# Altium integrated library Samtec_PC104_Plus.IntLib: 120 symbols (part 1 of 2) (continued)
## ESQT-108-02-M-D-315-PIH
designator J?
PC/104-Plus(TM) Flexible Elevated Socket Strips, Through-hole, Vertical, -55 to 125 degC, 2 mm Pitch, 16-Pin, Female, RoHS; Manufacturer: Samtec; PartNumber: ESQT-108-02-M-D-315-PIH; Pitch: 2 mm; DatasheetVersion: F-214; PackageVersion: BK, 10/1995; PackageReference: ESQT-108-02-X-D-315-PIH; PackageDescription: Elevated SQT ASSM; Orientation: Vertical; RoHS: True; Temperature Range: -55 to 125 degC; Mounting Technology: Through-hole; ComponentLink1Description: Manufacturer URL; ComponentLink1URL: http://www.samtec.com; ComponentLink2Description: Datasheet; ComponentLink2URL: http://www.samtec.com/documents/webfiles/pdf/ESQT_TH.PDF; ComponentLink3Description: Package Specification; ComponentLink3URL: http://www.samtec.com/documents/webfiles/cpdf/ESQT-1XX-XX-XX-X-XXX-XXX-XX-MKT.pdf
footprint SMTC-ESQT-108-02-X-D-315-PIH (Flexible Elevated Socket, 2x8 Pins, Vertical, 2mm Pitch, Female)
pins: 1, 2, 3, 4, 5, 6, 7, 8, 9, 10, 11, 12, 13, 14, 15, 16

## ESQT-110-02-F-D-342
designator J?
PC/104-Plus(TM) Flexible Elevated Socket Strips, Through-hole, Vertical, -55 to 125 degC, 2 mm Pitch, 20-Pin, Female, RoHS; Manufacturer: Samtec; PartNumber: ESQT-110-02-F-D-342; Pitch: 2 mm; DatasheetVersion: F-214; PackageVersion: BK, 10/1995; PackageReference: ESQT-110-02-X-D-342; PackageDescription: Elevated SQT ASSM; Orientation: Vertical; RoHS: True; Temperature Range: -55 to 125 degC; Mounting Technology: Through-hole; ComponentLink1Description: Manufacturer URL; ComponentLink1URL: http://www.samtec.com; ComponentLink2Description: Datasheet; ComponentLink2URL: http://www.samtec.com/documents/webfiles/pdf/ESQT_TH.PDF; ComponentLink3Description: Package Specification; ComponentLink3URL: http://www.samtec.com/documents/webfiles/cpdf/ESQT-1XX-XX-XX-X-XXX-XXX-XX-MKT.pdf
footprint SMTC-ESQT-110-02-X-D-342 (Flexible Elevated Socket, 2x10 Pins, Vertical, 2mm Pitch, Female)
pins: 1, 2, 3, 4, 5, 6, 7, 8, 9, 10, 11, 12, 13, 14, 15, 16, 17, 18, 19, 20

## ESQT-110-02-F-D-470
designator J?
PC/104-Plus(TM) Flexible Elevated Socket Strips, Through-hole, Vertical, -55 to 125 degC, 2 mm Pitch, 20-Pin, Female, RoHS; Manufacturer: Samtec; PartNumber: ESQT-110-02-F-D-470; Pitch: 2 mm; DatasheetVersion: F-214; PackageVersion: BK, 10/1995; PackageReference: ESQT-110-02-X-D-470; PackageDescription: Elevated SQT ASSM; Orientation: Vertical; RoHS: True; Temperature Range: -55 to 125 degC; Mounting Technology: Through-hole; ComponentLink1Description: Manufacturer URL; ComponentLink1URL: http://www.samtec.com; ComponentLink2Description: Datasheet; ComponentLink2URL: http://www.samtec.com/documents/webfiles/pdf/ESQT_TH.PDF; ComponentLink3Description: Package Specification; ComponentLink3URL: http://www.samtec.com/documents/webfiles/cpdf/ESQT-1XX-XX-XX-X-XXX-XXX-XX-MKT.pdf
footprint SMTC-ESQT-110-02-X-D-470 (Flexible Elevated Socket, 2x10 Pins, Vertical, 2mm Pitch, Female)
pins: 1, 2, 3, 4, 5, 6, 7, 8, 9, 10, 11, 12, 13, 14, 15, 16, 17, 18, 19, 20

## ESQT-110-02-GF-D-342
designator J?
PC/104-Plus(TM) Flexible Elevated Socket Strips, Through-hole, Vertical, -55 to 125 degC, 2 mm Pitch, 20-Pin, Female, RoHS; Manufacturer: Samtec; PartNumber: ESQT-110-02-GF-D-342; Pitch: 2 mm; DatasheetVersion: F-214; PackageVersion: BK, 10/1995; PackageReference: ESQT-110-02-X-D-342; PackageDescription: Elevated SQT ASSM; Orientation: Vertical; RoHS: True; Temperature Range: -55 to 125 degC; Mounting Technology: Through-hole; ComponentLink1Description: Manufacturer URL; ComponentLink1URL: http://www.samtec.com; ComponentLink2Description: Datasheet; ComponentLink2URL: http://www.samtec.com/documents/webfiles/pdf/ESQT_TH.PDF; ComponentLink3Description: Package Specification; ComponentLink3URL: http://www.samtec.com/documents/webfiles/cpdf/ESQT-1XX-XX-XX-X-XXX-XXX-XX-MKT.pdf
footprint SMTC-ESQT-110-02-X-D-342 (Flexible Elevated Socket, 2x10 Pins, Vertical, 2mm Pitch, Female)
pins: 1, 2, 3, 4, 5, 6, 7, 8, 9, 10, 11, 12, 13, 14, 15, 16, 17, 18, 19, 20

## ESQT-110-02-GF-D-470
designator J?
PC/104-Plus(TM) Flexible Elevated Socket Strips, Through-hole, Vertical, -55 to 125 degC, 2 mm Pitch, 20-Pin, Female, RoHS; Manufacturer: Samtec; PartNumber: ESQT-110-02-GF-D-470; Pitch: 2 mm; DatasheetVersion: F-214; PackageVersion: BK, 10/1995; PackageReference: ESQT-110-02-X-D-470; PackageDescription: Elevated SQT ASSM; Orientation: Vertical; RoHS: True; Temperature Range: -55 to 125 degC; Mounting Technology: Through-hole; ComponentLink1Description: Manufacturer URL; ComponentLink1URL: http://www.samtec.com; ComponentLink2Description: Datasheet; ComponentLink2URL: http://www.samtec.com/documents/webfiles/pdf/ESQT_TH.PDF; ComponentLink3Description: Package Specification; ComponentLink3URL: http://www.samtec.com/documents/webfiles/cpdf/ESQT-1XX-XX-XX-X-XXX-XXX-XX-MKT.pdf
footprint SMTC-ESQT-110-02-X-D-470 (Flexible Elevated Socket, 2x10 Pins, Vertical, 2mm Pitch, Female)
pins: 1, 2, 3, 4, 5, 6, 7, 8, 9, 10, 11, 12, 13, 14, 15, 16, 17, 18, 19, 20

## ESQT-110-02-L-D-342
designator J?
PC/104-Plus(TM) Flexible Elevated Socket Strips, Through-hole, Vertical, -55 to 125 degC, 2 mm Pitch, 20-Pin, Female, RoHS; Manufacturer: Samtec; PartNumber: ESQT-110-02-L-D-342; Pitch: 2 mm; DatasheetVersion: F-214; PackageVersion: BK, 10/1995; PackageReference: ESQT-110-02-X-D-342; PackageDescription: Elevated SQT ASSM; Orientation: Vertical; RoHS: True; Temperature Range: -55 to 125 degC; Mounting Technology: Through-hole; ComponentLink1Description: Manufacturer URL; ComponentLink1URL: http://www.samtec.com; ComponentLink2Description: Datasheet; ComponentLink2URL: http://www.samtec.com/documents/webfiles/pdf/ESQT_TH.PDF; ComponentLink3Description: Package Specification; ComponentLink3URL: http://www.samtec.com/documents/webfiles/cpdf/ESQT-1XX-XX-XX-X-XXX-XXX-XX-MKT.pdf
footprint SMTC-ESQT-110-02-X-D-342 (Flexible Elevated Socket, 2x10 Pins, Vertical, 2mm Pitch, Female)
pins: 1, 2, 3, 4, 5, 6, 7, 8, 9, 10, 11, 12, 13, 14, 15, 16, 17, 18, 19, 20

## ESQT-110-02-L-D-470
designator J?
PC/104-Plus(TM) Flexible Elevated Socket Strips, Through-hole, Vertical, -55 to 125 degC, 2 mm Pitch, 20-Pin, Female, RoHS; Manufacturer: Samtec; PartNumber: ESQT-110-02-L-D-470; Pitch: 2 mm; DatasheetVersion: F-214; PackageVersion: BK, 10/1995; PackageReference: ESQT-110-02-X-D-470; PackageDescription: Elevated SQT ASSM; Orientation: Vertical; RoHS: True; Temperature Range: -55 to 125 degC; Mounting Technology: Through-hole; ComponentLink1Description: Manufacturer URL; ComponentLink1URL: http://www.samtec.com; ComponentLink2Description: Datasheet; ComponentLink2URL: http://www.samtec.com/documents/webfiles/pdf/ESQT_TH.PDF; ComponentLink3Description: Package Specification; ComponentLink3URL: http://www.samtec.com/documents/webfiles/cpdf/ESQT-1XX-XX-XX-X-XXX-XXX-XX-MKT.pdf
footprint SMTC-ESQT-110-02-X-D-470 (Flexible Elevated Socket, 2x10 Pins, Vertical, 2mm Pitch, Female)
pins: 1, 2, 3, 4, 5, 6, 7, 8, 9, 10, 11, 12, 13, 14, 15, 16, 17, 18, 19, 20

## ESQT-110-02-M-D-342
designator J?
PC/104-Plus(TM) Flexible Elevated Socket Strips, Through-hole, Vertical, -55 to 125 degC, 2 mm Pitch, 20-Pin, Female, RoHS; Manufacturer: Samtec; PartNumber: ESQT-110-02-M-D-342; Pitch: 2 mm; DatasheetVersion: F-214; PackageVersion: BK, 10/1995; PackageReference: ESQT-110-02-X-D-342; PackageDescription: Elevated SQT ASSM; Orientation: Vertical; RoHS: True; Temperature Range: -55 to 125 degC; Mounting Technology: Through-hole; ComponentLink1Description: Manufacturer URL; ComponentLink1URL: http://www.samtec.com; ComponentLink2Description: Datasheet; ComponentLink2URL: http://www.samtec.com/documents/webfiles/pdf/ESQT_TH.PDF; ComponentLink3Description: Package Specification; ComponentLink3URL: http://www.samtec.com/documents/webfiles/cpdf/ESQT-1XX-XX-XX-X-XXX-XXX-XX-MKT.pdf
footprint SMTC-ESQT-110-02-X-D-342 (Flexible Elevated Socket, 2x10 Pins, Vertical, 2mm Pitch, Female)
pins: 1, 2, 3, 4, 5, 6, 7, 8, 9, 10, 11, 12, 13, 14, 15, 16, 17, 18, 19, 20

## ESQT-110-02-M-D-470
designator J?
PC/104-Plus(TM) Flexible Elevated Socket Strips, Through-hole, Vertical, -55 to 125 degC, 2 mm Pitch, 20-Pin, Female, RoHS; Manufacturer: Samtec; PartNumber: ESQT-110-02-M-D-470; Pitch: 2 mm; DatasheetVersion: F-214; PackageVersion: BK, 10/1995; PackageReference: ESQT-110-02-X-D-470; PackageDescription: Elevated SQT ASSM; Orientation: Vertical; RoHS: True; Temperature Range: -55 to 125 degC; Mounting Technology: Through-hole; ComponentLink1Description: Manufacturer URL; ComponentLink1URL: http://www.samtec.com; ComponentLink2Description: Datasheet; ComponentLink2URL: http://www.samtec.com/documents/webfiles/pdf/ESQT_TH.PDF; ComponentLink3Description: Package Specification; ComponentLink3URL: http://www.samtec.com/documents/webfiles/cpdf/ESQT-1XX-XX-XX-X-XXX-XXX-XX-MKT.pdf
footprint SMTC-ESQT-110-02-X-D-470 (Flexible Elevated Socket, 2x10 Pins, Vertical, 2mm Pitch, Female)
pins: 1, 2, 3, 4, 5, 6, 7, 8, 9, 10, 11, 12, 13, 14, 15, 16, 17, 18, 19, 20

## ESQT-113-02-F-D-665
designator J?
PC/104-Plus(TM) Flexible Elevated Socket Strips, Through-hole, Vertical, -55 to 125 degC, 2 mm Pitch, 26-Pin, Female, RoHS; Manufacturer: Samtec; PartNumber: ESQT-113-02-F-D-665; Pitch: 2 mm; DatasheetVersion: F-214; PackageVersion: BK, 10/1995; PackageReference: ESQT-113-02-X-D-665; PackageDescription: Elevated SQT ASSM; Orientation: Vertical; RoHS: True; Temperature Range: -55 to 125 degC; Mounting Technology: Through-hole; ComponentLink1Description: Manufacturer URL; ComponentLink1URL: http://www.samtec.com; ComponentLink2Description: Datasheet; ComponentLink2URL: http://www.samtec.com/documents/webfiles/pdf/ESQT_TH.PDF; ComponentLink3Description: Package Specification; ComponentLink3URL: http://www.samtec.com/documents/webfiles/cpdf/ESQT-1XX-XX-XX-X-XXX-XXX-XX-MKT.pdf
footprint SMTC-ESQT-113-02-X-D-665 (Flexible Elevated Socket, 2x13 Pins, Vertical, 2mm Pitch, Female)
pins: 1, 2, 3, 4, 5, 6, 7, 8, 9, 10, 11, 12, 13, 14, 15, 16, 17, 18, 19, 20, 21, 22, 23, 24, 25, 26

## ESQT-113-02-F-D-730
designator J?
PC/104-Plus(TM) Flexible Elevated Socket Strips, Through-hole, Vertical, -55 to 125 degC, 2 mm Pitch, 26-Pin, Female, RoHS; Manufacturer: Samtec; PartNumber: ESQT-113-02-F-D-730; Pitch: 2 mm; DatasheetVersion: F-214; PackageVersion: BK, 10/1995; PackageReference: ESQT-113-02-X-D-730; PackageDescription: Elevated SQT ASSM; Orientation: Vertical; RoHS: True; Temperature Range: -55 to 125 degC; Mounting Technology: Through-hole; ComponentLink1Description: Manufacturer URL; ComponentLink1URL: http://www.samtec.com; ComponentLink2Description: Datasheet; ComponentLink2URL: http://www.samtec.com/documents/webfiles/pdf/ESQT_TH.PDF; ComponentLink3Description: Package Specification; ComponentLink3URL: http://www.samtec.com/documents/webfiles/cpdf/ESQT-1XX-XX-XX-X-XXX-XXX-XX-MKT.pdf
footprint SMTC-ESQT-113-02-X-D-730 (Flexible Elevated Socket, 2x13 Pins, Vertical, 2mm Pitch, Female)
pins: 1, 2, 3, 4, 5, 6, 7, 8, 9, 10, 11, 12, 13, 14, 15, 16, 17, 18, 19, 20, 21, 22, 23, 24, 25, 26

## ESQT-113-02-GF-D-665
designator J?
PC/104-Plus(TM) Flexible Elevated Socket Strips, Through-hole, Vertical, -55 to 125 degC, 2 mm Pitch, 26-Pin, Female, RoHS; Manufacturer: Samtec; PartNumber: ESQT-113-02-GF-D-665; Pitch: 2 mm; DatasheetVersion: F-214; PackageVersion: BK, 10/1995; PackageReference: ESQT-113-02-X-D-665; PackageDescription: Elevated SQT ASSM; Orientation: Vertical; RoHS: True; Temperature Range: -55 to 125 degC; Mounting Technology: Through-hole; ComponentLink1Description: Manufacturer URL; ComponentLink1URL: http://www.samtec.com; ComponentLink2Description: Datasheet; ComponentLink2URL: http://www.samtec.com/documents/webfiles/pdf/ESQT_TH.PDF; ComponentLink3Description: Package Specification; ComponentLink3URL: http://www.samtec.com/documents/webfiles/cpdf/ESQT-1XX-XX-XX-X-XXX-XXX-XX-MKT.pdf
footprint SMTC-ESQT-113-02-X-D-665 (Flexible Elevated Socket, 2x13 Pins, Vertical, 2mm Pitch, Female)
pins: 1, 2, 3, 4, 5, 6, 7, 8, 9, 10, 11, 12, 13, 14, 15, 16, 17, 18, 19, 20, 21, 22, 23, 24, 25, 26

## ESQT-113-02-GF-D-730
designator J?
PC/104-Plus(TM) Flexible Elevated Socket Strips, Through-hole, Vertical, -55 to 125 degC, 2 mm Pitch, 26-Pin, Female, RoHS; Manufacturer: Samtec; PartNumber: ESQT-113-02-GF-D-730; Pitch: 2 mm; DatasheetVersion: F-214; PackageVersion: BK, 10/1995; PackageReference: ESQT-113-02-X-D-730; PackageDescription: Elevated SQT ASSM; Orientation: Vertical; RoHS: True; Temperature Range: -55 to 125 degC; Mounting Technology: Through-hole; ComponentLink1Description: Manufacturer URL; ComponentLink1URL: http://www.samtec.com; ComponentLink2Description: Datasheet; ComponentLink2URL: http://www.samtec.com/documents/webfiles/pdf/ESQT_TH.PDF; ComponentLink3Description: Package Specification; ComponentLink3URL: http://www.samtec.com/documents/webfiles/cpdf/ESQT-1XX-XX-XX-X-XXX-XXX-XX-MKT.pdf
footprint SMTC-ESQT-113-02-X-D-730 (Flexible Elevated Socket, 2x13 Pins, Vertical, 2mm Pitch, Female)
pins: 1, 2, 3, 4, 5, 6, 7, 8, 9, 10, 11, 12, 13, 14, 15, 16, 17, 18, 19, 20, 21, 22, 23, 24, 25, 26

## ESQT-113-02-L-D-665
designator J?
PC/104-Plus(TM) Flexible Elevated Socket Strips, Through-hole, Vertical, -55 to 125 degC, 2 mm Pitch, 26-Pin, Female, RoHS; Manufacturer: Samtec; PartNumber: ESQT-113-02-L-D-665; Pitch: 2 mm; DatasheetVersion: F-214; PackageVersion: BK, 10/1995; PackageReference: ESQT-113-02-X-D-665; PackageDescription: Elevated SQT ASSM; Orientation: Vertical; RoHS: True; Temperature Range: -55 to 125 degC; Mounting Technology: Through-hole; ComponentLink1Description: Manufacturer URL; ComponentLink1URL: http://www.samtec.com; ComponentLink2Description: Datasheet; ComponentLink2URL: http://www.samtec.com/documents/webfiles/pdf/ESQT_TH.PDF; ComponentLink3Description: Package Specification; ComponentLink3URL: http://www.samtec.com/documents/webfiles/cpdf/ESQT-1XX-XX-XX-X-XXX-XXX-XX-MKT.pdf
footprint SMTC-ESQT-113-02-X-D-665 (Flexible Elevated Socket, 2x13 Pins, Vertical, 2mm Pitch, Female)
pins: 1, 2, 3, 4, 5, 6, 7, 8, 9, 10, 11, 12, 13, 14, 15, 16, 17, 18, 19, 20, 21, 22, 23, 24, 25, 26

## ESQT-113-02-L-D-730
designator J?
PC/104-Plus(TM) Flexible Elevated Socket Strips, Through-hole, Vertical, -55 to 125 degC, 2 mm Pitch, 26-Pin, Female, RoHS; Manufacturer: Samtec; PartNumber: ESQT-113-02-L-D-730; Pitch: 2 mm; DatasheetVersion: F-214; PackageVersion: BK, 10/1995; PackageReference: ESQT-113-02-X-D-730; PackageDescription: Elevated SQT ASSM; Orientation: Vertical; RoHS: True; Temperature Range: -55 to 125 degC; Mounting Technology: Through-hole; ComponentLink1Description: Manufacturer URL; ComponentLink1URL: http://www.samtec.com; ComponentLink2Description: Datasheet; ComponentLink2URL: http://www.samtec.com/documents/webfiles/pdf/ESQT_TH.PDF; ComponentLink3Description: Package Specification; ComponentLink3URL: http://www.samtec.com/documents/webfiles/cpdf/ESQT-1XX-XX-XX-X-XXX-XXX-XX-MKT.pdf
footprint SMTC-ESQT-113-02-X-D-730 (Flexible Elevated Socket, 2x13 Pins, Vertical, 2mm Pitch, Female)
pins: 1, 2, 3, 4, 5, 6, 7, 8, 9, 10, 11, 12, 13, 14, 15, 16, 17, 18, 19, 20, 21, 22, 23, 24, 25, 26

## ESQT-113-02-M-D-665
designator J?
PC/104-Plus(TM) Flexible Elevated Socket Strips, Through-hole, Vertical, -55 to 125 degC, 2 mm Pitch, 26-Pin, Female, RoHS; Manufacturer: Samtec; PartNumber: ESQT-113-02-M-D-665; Pitch: 2 mm; DatasheetVersion: F-214; PackageVersion: BK, 10/1995; PackageReference: ESQT-113-02-X-D-665; PackageDescription: Elevated SQT ASSM; Orientation: Vertical; RoHS: True; Temperature Range: -55 to 125 degC; Mounting Technology: Through-hole; ComponentLink1Description: Manufacturer URL; ComponentLink1URL: http://www.samtec.com; ComponentLink2Description: Datasheet; ComponentLink2URL: http://www.samtec.com/documents/webfiles/pdf/ESQT_TH.PDF; ComponentLink3Description: Package Specification; ComponentLink3URL: http://www.samtec.com/documents/webfiles/cpdf/ESQT-1XX-XX-XX-X-XXX-XXX-XX-MKT.pdf
footprint SMTC-ESQT-113-02-X-D-665 (Flexible Elevated Socket, 2x13 Pins, Vertical, 2mm Pitch, Female)
pins: 1, 2, 3, 4, 5, 6, 7, 8, 9, 10, 11, 12, 13, 14, 15, 16, 17, 18, 19, 20, 21, 22, 23, 24, 25, 26

## ESQT-113-02-M-D-730
designator J?
PC/104-Plus(TM) Flexible Elevated Socket Strips, Through-hole, Vertical, -55 to 125 degC, 2 mm Pitch, 26-Pin, Female, RoHS; Manufacturer: Samtec; PartNumber: ESQT-113-02-M-D-730; Pitch: 2 mm; DatasheetVersion: F-214; PackageVersion: BK, 10/1995; PackageReference: ESQT-113-02-X-D-730; PackageDescription: Elevated SQT ASSM; Orientation: Vertical; RoHS: True; Temperature Range: -55 to 125 degC; Mounting Technology: Through-hole; ComponentLink1Description: Manufacturer URL; ComponentLink1URL: http://www.samtec.com; ComponentLink2Description: Datasheet; ComponentLink2URL: http://www.samtec.com/documents/webfiles/pdf/ESQT_TH.PDF; ComponentLink3Description: Package Specification; ComponentLink3URL: http://www.samtec.com/documents/webfiles/cpdf/ESQT-1XX-XX-XX-X-XXX-XXX-XX-MKT.pdf
footprint SMTC-ESQT-113-02-X-D-730 (Flexible Elevated Socket, 2x13 Pins, Vertical, 2mm Pitch, Female)
pins: 1, 2, 3, 4, 5, 6, 7, 8, 9, 10, 11, 12, 13, 14, 15, 16, 17, 18, 19, 20, 21, 22, 23, 24, 25, 26

## ESQT-117-03-F-D-350
designator J?
PC/104-Plus(TM) Flexible Elevated Socket Strips, Through-hole, Vertical, -55 to 125 degC, 2 mm Pitch, 34-Pin, Female, RoHS; Manufacturer: Samtec; PartNumber: ESQT-117-03-F-D-350; Pitch: 2 mm; DatasheetVersion: F-214; PackageVersion: BK, 10/1995; PackageReference: ESQT-117-03-X-D-350; PackageDescription: Elevated SQT ASSM; Orientation: Vertical; RoHS: True; Temperature Range: -55 to 125 degC; Mounting Technology: Through-hole; ComponentLink1Description: Manufacturer URL; ComponentLink1URL: http://www.samtec.com; ComponentLink2Description: Datasheet; ComponentLink2URL: http://www.samtec.com/documents/webfiles/pdf/ESQT_TH.PDF; ComponentLink3Description: Package Specification; ComponentLink3URL: http://www.samtec.com/documents/webfiles/cpdf/ESQT-1XX-XX-XX-X-XXX-XXX-XX-MKT.pdf
footprint SMTC-ESQT-117-03-X-D-350 (Flexible Elevated Socket, 2x17 Pins, Vertical, 2mm Pitch, Female)
pins: 1, 2, 3, 4, 5, 6, 7, 8, 9, 10, 11, 12, 13, 14, 15, 16, 17, 18, 19, 20, 21, 22, 23, 24, 25, 26, 27, 28, 29, 30, 31, 32, 33, 34

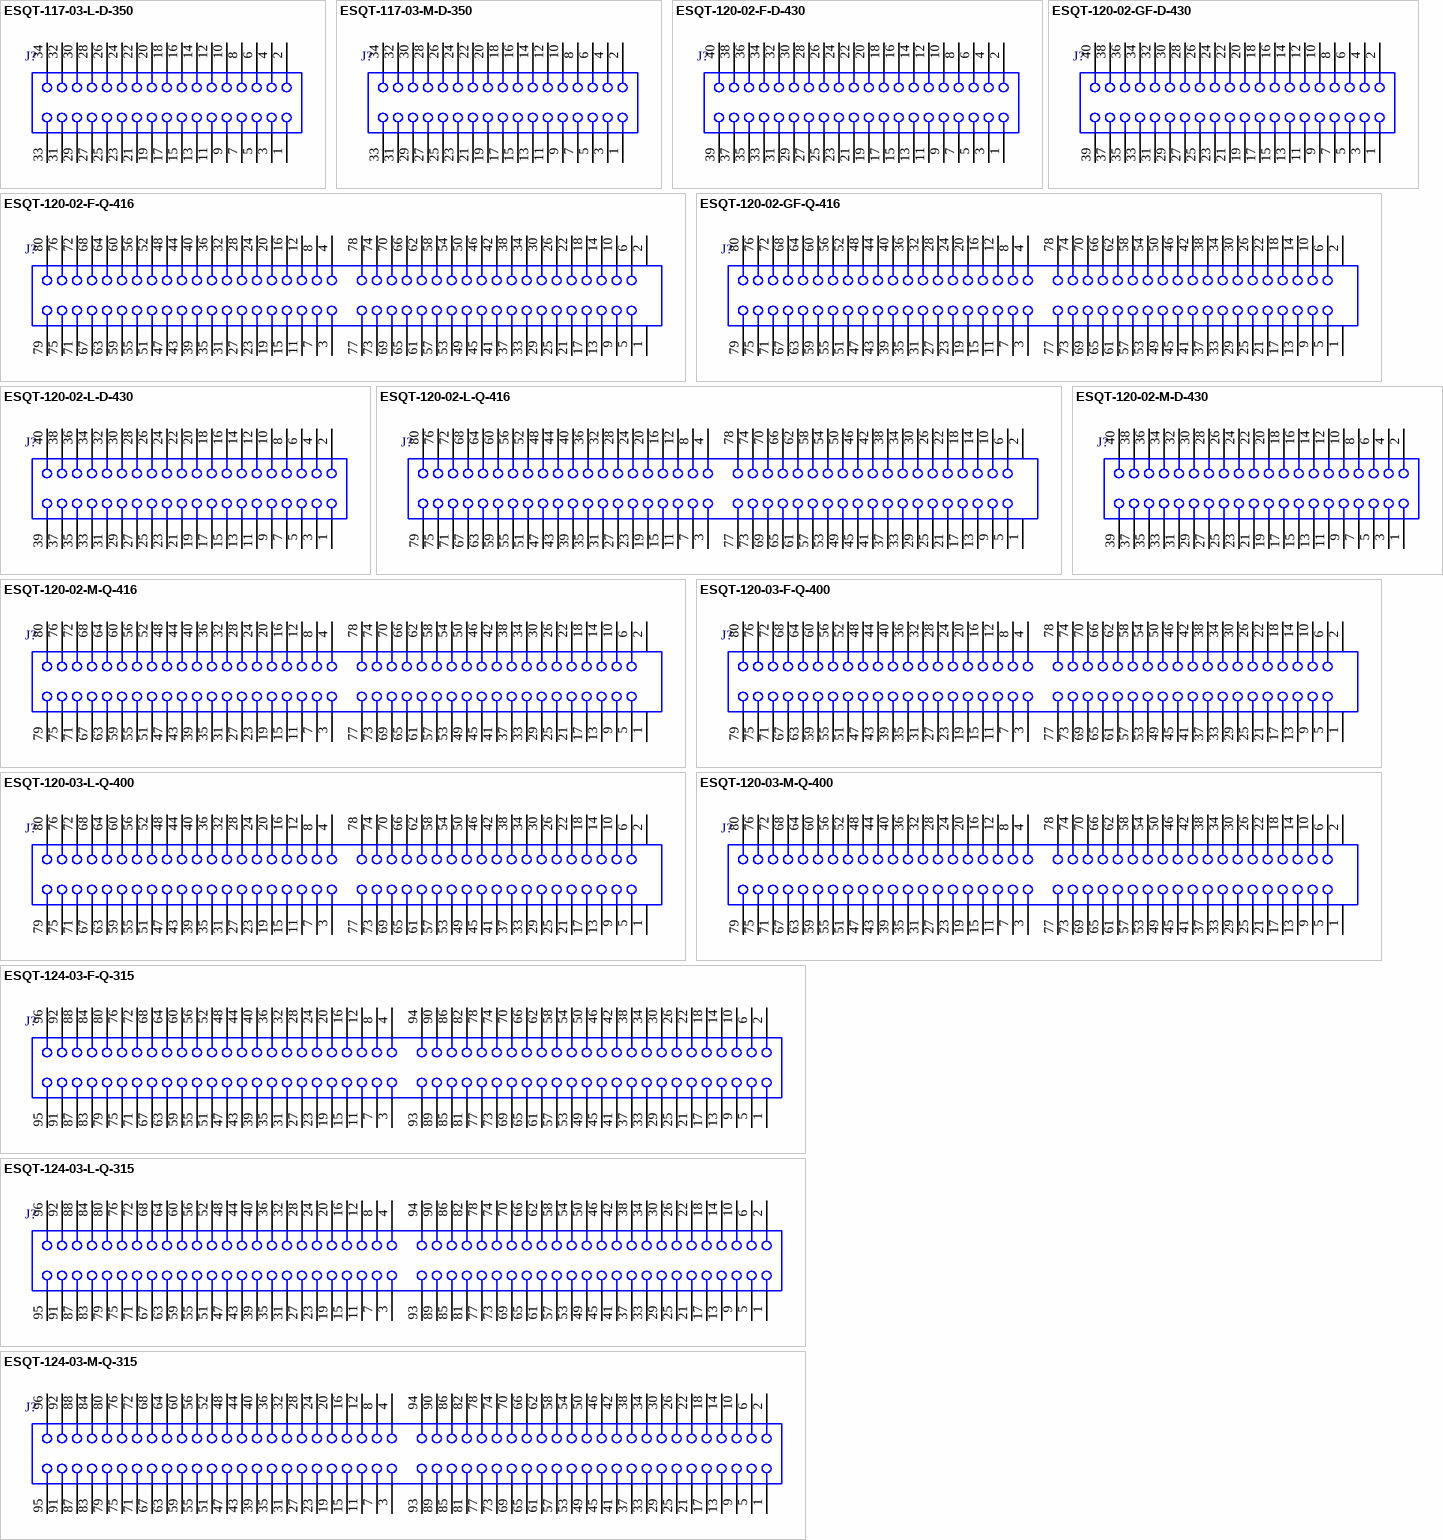
[diagram p3: symbols ESQT-117-03-L-D-350 to ESQT-124-03-M-Q-315]

## ESQT-117-03-L-D-350
designator J?
PC/104-Plus(TM) Flexible Elevated Socket Strips, Through-hole, Vertical, -55 to 125 degC, 2 mm Pitch, 34-Pin, Female, RoHS; Manufacturer: Samtec; PartNumber: ESQT-117-03-L-D-350; Pitch: 2 mm; DatasheetVersion: F-214; PackageVersion: BK, 10/1995; PackageReference: ESQT-117-03-X-D-350; PackageDescription: Elevated SQT ASSM; Orientation: Vertical; RoHS: True; Temperature Range: -55 to 125 degC; Mounting Technology: Through-hole; ComponentLink1Description: Manufacturer URL; ComponentLink1URL: http://www.samtec.com; ComponentLink2Description: Datasheet; ComponentLink2URL: http://www.samtec.com/documents/webfiles/pdf/ESQT_TH.PDF; ComponentLink3Description: Package Specification; ComponentLink3URL: http://www.samtec.com/documents/webfiles/cpdf/ESQT-1XX-XX-XX-X-XXX-XXX-XX-MKT.pdf
footprint SMTC-ESQT-117-03-X-D-350 (Flexible Elevated Socket, 2x17 Pins, Vertical, 2mm Pitch, Female)
pins: 1, 2, 3, 4, 5, 6, 7, 8, 9, 10, 11, 12, 13, 14, 15, 16, 17, 18, 19, 20, 21, 22, 23, 24, 25, 26, 27, 28, 29, 30, 31, 32, 33, 34

## ESQT-117-03-M-D-350
designator J?
PC/104-Plus(TM) Flexible Elevated Socket Strips, Through-hole, Vertical, -55 to 125 degC, 2 mm Pitch, 34-Pin, Female, RoHS; Manufacturer: Samtec; PartNumber: ESQT-117-03-M-D-350; Pitch: 2 mm; DatasheetVersion: F-214; PackageVersion: BK, 10/1995; PackageReference: ESQT-117-03-X-D-350; PackageDescription: Elevated SQT ASSM; Orientation: Vertical; RoHS: True; Temperature Range: -55 to 125 degC; Mounting Technology: Through-hole; ComponentLink1Description: Manufacturer URL; ComponentLink1URL: http://www.samtec.com; ComponentLink2Description: Datasheet; ComponentLink2URL: http://www.samtec.com/documents/webfiles/pdf/ESQT_TH.PDF; ComponentLink3Description: Package Specification; ComponentLink3URL: http://www.samtec.com/documents/webfiles/cpdf/ESQT-1XX-XX-XX-X-XXX-XXX-XX-MKT.pdf
footprint SMTC-ESQT-117-03-X-D-350 (Flexible Elevated Socket, 2x17 Pins, Vertical, 2mm Pitch, Female)
pins: 1, 2, 3, 4, 5, 6, 7, 8, 9, 10, 11, 12, 13, 14, 15, 16, 17, 18, 19, 20, 21, 22, 23, 24, 25, 26, 27, 28, 29, 30, 31, 32, 33, 34

## ESQT-120-02-F-D-430
designator J?
PC/104-Plus(TM) Flexible Elevated Socket Strips, Through-hole, Vertical, -55 to 125 degC, 2 mm Pitch, 40-Pin, Female, RoHS; Manufacturer: Samtec; PartNumber: ESQT-120-02-F-D-430; Pitch: 2 mm; DatasheetVersion: F-214; PackageVersion: BK, 10/1995; PackageReference: ESQT-120-02-X-D-430; PackageDescription: Elevated SQT ASSM; Orientation: Vertical; RoHS: True; Temperature Range: -55 to 125 degC; Mounting Technology: Through-hole; ComponentLink1Description: Manufacturer URL; ComponentLink1URL: http://www.samtec.com; ComponentLink2Description: Datasheet; ComponentLink2URL: http://www.samtec.com/documents/webfiles/pdf/ESQT_TH.PDF; ComponentLink3Description: Package Specification; ComponentLink3URL: http://www.samtec.com/documents/webfiles/cpdf/ESQT-1XX-XX-XX-X-XXX-XXX-XX-MKT.pdf
footprint SMTC-ESQT-120-02-X-D-430 (Flexible Elevated Socket, 2x20 Pins, Vertical, 2mm Pitch, Female)
pins: 1, 2, 3, 4, 5, 6, 7, 8, 9, 10, 11, 12, 13, 14, 15, 16, 17, 18, 19, 20, 21, 22, 23, 24, 25, 26, 27, 28, 29, 30, 31, 32, 33, 34, 35, 36, 37, 38, 39, 40

## ESQT-120-02-F-Q-416
designator J?
PC/104-Plus(TM) Flexible Elevated Socket Strips, Through-hole, Vertical, -55 to 125 degC, 2 mm Pitch, 80-Pin, Female, RoHS; Manufacturer: Samtec; PartNumber: ESQT-120-02-F-Q-416; Pitch: 2 mm; DatasheetVersion: F-214; PackageVersion: BK, 10/1995; PackageReference: ESQT-120-02-X-Q-416; PackageDescription: Elevated SQT ASSM; Orientation: Vertical; RoHS: True; Temperature Range: -55 to 125 degC; Mounting Technology: Through-hole; ComponentLink1Description: Manufacturer URL; ComponentLink1URL: http://www.samtec.com; ComponentLink2Description: Datasheet; ComponentLink2URL: http://www.samtec.com/documents/webfiles/pdf/ESQT_TH.PDF; ComponentLink3Description: Package Specification; ComponentLink3URL: http://www.samtec.com/documents/webfiles/cpdf/ESQT-1XX-XX-XX-X-XXX-XXX-XX-MKT.pdf
footprint SMTC-ESQT-120-02-X-Q-416 (Flexible Elevated Socket, 4x20 Pins, Vertical, 2mm Pitch, Female)
pins: 1, 2, 3, 4, 5, 6, 7, 8, 9, 10, 11, 12, 13, 14, 15, 16, 17, 18, 19, 20, 21, 22, 23, 24, 25, 26, 27, 28, 29, 30, 31, 32, 33, 34, 35, 36, 37, 38, 39, 40, 41, 42, 43, 44, 45, 46, 47, 48, 49, 50, 51, 52, 53, 54, 55, 56, 57, 58, 59, 60, 61, 62, 63, 64, 65, 66, 67, 68, 69, 70, 71, 72, 73, 74, 75, 76, 77, 78, 79, 80

## ESQT-120-02-GF-D-430
designator J?
PC/104-Plus(TM) Flexible Elevated Socket Strips, Through-hole, Vertical, -55 to 125 degC, 2 mm Pitch, 40-Pin, Female, RoHS; Manufacturer: Samtec; PartNumber: ESQT-120-02-GF-D-430; Pitch: 2 mm; DatasheetVersion: F-214; PackageVersion: BK, 10/1995; PackageReference: ESQT-120-02-X-D-430; PackageDescription: Elevated SQT ASSM; Orientation: Vertical; RoHS: True; Temperature Range: -55 to 125 degC; Mounting Technology: Through-hole; ComponentLink1Description: Manufacturer URL; ComponentLink1URL: http://www.samtec.com; ComponentLink2Description: Datasheet; ComponentLink2URL: http://www.samtec.com/documents/webfiles/pdf/ESQT_TH.PDF; ComponentLink3Description: Package Specification; ComponentLink3URL: http://www.samtec.com/documents/webfiles/cpdf/ESQT-1XX-XX-XX-X-XXX-XXX-XX-MKT.pdf
footprint SMTC-ESQT-120-02-X-D-430 (Flexible Elevated Socket, 2x20 Pins, Vertical, 2mm Pitch, Female)
pins: 1, 2, 3, 4, 5, 6, 7, 8, 9, 10, 11, 12, 13, 14, 15, 16, 17, 18, 19, 20, 21, 22, 23, 24, 25, 26, 27, 28, 29, 30, 31, 32, 33, 34, 35, 36, 37, 38, 39, 40

## ESQT-120-02-GF-Q-416
designator J?
PC/104-Plus(TM) Flexible Elevated Socket Strips, Through-hole, Vertical, -55 to 125 degC, 2 mm Pitch, 80-Pin, Female, RoHS; Manufacturer: Samtec; PartNumber: ESQT-120-02-GF-Q-416; Pitch: 2 mm; DatasheetVersion: F-214; PackageVersion: BK, 10/1995; PackageReference: ESQT-120-02-X-Q-416; PackageDescription: Elevated SQT ASSM; Orientation: Vertical; RoHS: True; Temperature Range: -55 to 125 degC; Mounting Technology: Through-hole; ComponentLink1Description: Manufacturer URL; ComponentLink1URL: http://www.samtec.com; ComponentLink2Description: Datasheet; ComponentLink2URL: http://www.samtec.com/documents/webfiles/pdf/ESQT_TH.PDF; ComponentLink3Description: Package Specification; ComponentLink3URL: http://www.samtec.com/documents/webfiles/cpdf/ESQT-1XX-XX-XX-X-XXX-XXX-XX-MKT.pdf
footprint SMTC-ESQT-120-02-X-Q-416 (Flexible Elevated Socket, 4x20 Pins, Vertical, 2mm Pitch, Female)
pins: 1, 2, 3, 4, 5, 6, 7, 8, 9, 10, 11, 12, 13, 14, 15, 16, 17, 18, 19, 20, 21, 22, 23, 24, 25, 26, 27, 28, 29, 30, 31, 32, 33, 34, 35, 36, 37, 38, 39, 40, 41, 42, 43, 44, 45, 46, 47, 48, 49, 50, 51, 52, 53, 54, 55, 56, 57, 58, 59, 60, 61, 62, 63, 64, 65, 66, 67, 68, 69, 70, 71, 72, 73, 74, 75, 76, 77, 78, 79, 80

## ESQT-120-02-L-D-430
designator J?
PC/104-Plus(TM) Flexible Elevated Socket Strips, Through-hole, Vertical, -55 to 125 degC, 2 mm Pitch, 40-Pin, Female, RoHS; Manufacturer: Samtec; PartNumber: ESQT-120-02-L-D-430; Pitch: 2 mm; DatasheetVersion: F-214; PackageVersion: BK, 10/1995; PackageReference: ESQT-120-02-X-D-430; PackageDescription: Elevated SQT ASSM; Orientation: Vertical; RoHS: True; Temperature Range: -55 to 125 degC; Mounting Technology: Through-hole; ComponentLink1Description: Manufacturer URL; ComponentLink1URL: http://www.samtec.com; ComponentLink2Description: Datasheet; ComponentLink2URL: http://www.samtec.com/documents/webfiles/pdf/ESQT_TH.PDF; ComponentLink3Description: Package Specification; ComponentLink3URL: http://www.samtec.com/documents/webfiles/cpdf/ESQT-1XX-XX-XX-X-XXX-XXX-XX-MKT.pdf
footprint SMTC-ESQT-120-02-X-D-430 (Flexible Elevated Socket, 2x20 Pins, Vertical, 2mm Pitch, Female)
pins: 1, 2, 3, 4, 5, 6, 7, 8, 9, 10, 11, 12, 13, 14, 15, 16, 17, 18, 19, 20, 21, 22, 23, 24, 25, 26, 27, 28, 29, 30, 31, 32, 33, 34, 35, 36, 37, 38, 39, 40

## ESQT-120-02-L-Q-416
designator J?
PC/104-Plus(TM) Flexible Elevated Socket Strips, Through-hole, Vertical, -55 to 125 degC, 2 mm Pitch, 80-Pin, Female, RoHS; Manufacturer: Samtec; PartNumber: ESQT-120-02-L-Q-416; Pitch: 2 mm; DatasheetVersion: F-214; PackageVersion: BK, 10/1995; PackageReference: ESQT-120-02-X-Q-416; PackageDescription: Elevated SQT ASSM; Orientation: Vertical; RoHS: True; Temperature Range: -55 to 125 degC; Mounting Technology: Through-hole; ComponentLink1Description: Manufacturer URL; ComponentLink1URL: http://www.samtec.com; ComponentLink2Description: Datasheet; ComponentLink2URL: http://www.samtec.com/documents/webfiles/pdf/ESQT_TH.PDF; ComponentLink3Description: Package Specification; ComponentLink3URL: http://www.samtec.com/documents/webfiles/cpdf/ESQT-1XX-XX-XX-X-XXX-XXX-XX-MKT.pdf
footprint SMTC-ESQT-120-02-X-Q-416 (Flexible Elevated Socket, 4x20 Pins, Vertical, 2mm Pitch, Female)
pins: 1, 2, 3, 4, 5, 6, 7, 8, 9, 10, 11, 12, 13, 14, 15, 16, 17, 18, 19, 20, 21, 22, 23, 24, 25, 26, 27, 28, 29, 30, 31, 32, 33, 34, 35, 36, 37, 38, 39, 40, 41, 42, 43, 44, 45, 46, 47, 48, 49, 50, 51, 52, 53, 54, 55, 56, 57, 58, 59, 60, 61, 62, 63, 64, 65, 66, 67, 68, 69, 70, 71, 72, 73, 74, 75, 76, 77, 78, 79, 80

## ESQT-120-02-M-D-430
designator J?
PC/104-Plus(TM) Flexible Elevated Socket Strips, Through-hole, Vertical, -55 to 125 degC, 2 mm Pitch, 40-Pin, Female, RoHS; Manufacturer: Samtec; PartNumber: ESQT-120-02-M-D-430; Pitch: 2 mm; DatasheetVersion: F-214; PackageVersion: BK, 10/1995; PackageReference: ESQT-120-02-X-D-430; PackageDescription: Elevated SQT ASSM; Orientation: Vertical; RoHS: True; Temperature Range: -55 to 125 degC; Mounting Technology: Through-hole; ComponentLink1Description: Manufacturer URL; ComponentLink1URL: http://www.samtec.com; ComponentLink2Description: Datasheet; ComponentLink2URL: http://www.samtec.com/documents/webfiles/pdf/ESQT_TH.PDF; ComponentLink3Description: Package Specification; ComponentLink3URL: http://www.samtec.com/documents/webfiles/cpdf/ESQT-1XX-XX-XX-X-XXX-XXX-XX-MKT.pdf
footprint SMTC-ESQT-120-02-X-D-430 (Flexible Elevated Socket, 2x20 Pins, Vertical, 2mm Pitch, Female)
pins: 1, 2, 3, 4, 5, 6, 7, 8, 9, 10, 11, 12, 13, 14, 15, 16, 17, 18, 19, 20, 21, 22, 23, 24, 25, 26, 27, 28, 29, 30, 31, 32, 33, 34, 35, 36, 37, 38, 39, 40

## ESQT-120-02-M-Q-416
designator J?
PC/104-Plus(TM) Flexible Elevated Socket Strips, Through-hole, Vertical, -55 to 125 degC, 2 mm Pitch, 80-Pin, Female, RoHS; Manufacturer: Samtec; PartNumber: ESQT-120-02-M-Q-416; Pitch: 2 mm; DatasheetVersion: F-214; PackageVersion: BK, 10/1995; PackageReference: ESQT-120-02-X-Q-416; PackageDescription: Elevated SQT ASSM; Orientation: Vertical; RoHS: True; Temperature Range: -55 to 125 degC; Mounting Technology: Through-hole; ComponentLink1Description: Manufacturer URL; ComponentLink1URL: http://www.samtec.com; ComponentLink2Description: Datasheet; ComponentLink2URL: http://www.samtec.com/documents/webfiles/pdf/ESQT_TH.PDF; ComponentLink3Description: Package Specification; ComponentLink3URL: http://www.samtec.com/documents/webfiles/cpdf/ESQT-1XX-XX-XX-X-XXX-XXX-XX-MKT.pdf
footprint SMTC-ESQT-120-02-X-Q-416 (Flexible Elevated Socket, 4x20 Pins, Vertical, 2mm Pitch, Female)
pins: 1, 2, 3, 4, 5, 6, 7, 8, 9, 10, 11, 12, 13, 14, 15, 16, 17, 18, 19, 20, 21, 22, 23, 24, 25, 26, 27, 28, 29, 30, 31, 32, 33, 34, 35, 36, 37, 38, 39, 40, 41, 42, 43, 44, 45, 46, 47, 48, 49, 50, 51, 52, 53, 54, 55, 56, 57, 58, 59, 60, 61, 62, 63, 64, 65, 66, 67, 68, 69, 70, 71, 72, 73, 74, 75, 76, 77, 78, 79, 80